# Altium footprint library ParsaLibrary.PcbLib: 526 footprints (part 26 of 33)
Each footprint in its own frame and in the unit in brackets; x right, y up, seen from the top. Pads: shape width x height; smd on the part's side, far side on the other; paste and mask are expansions set on the pad; w line width, h text height; cw(c..) or ccw(c..) is an arc to the next point about the centre after c.
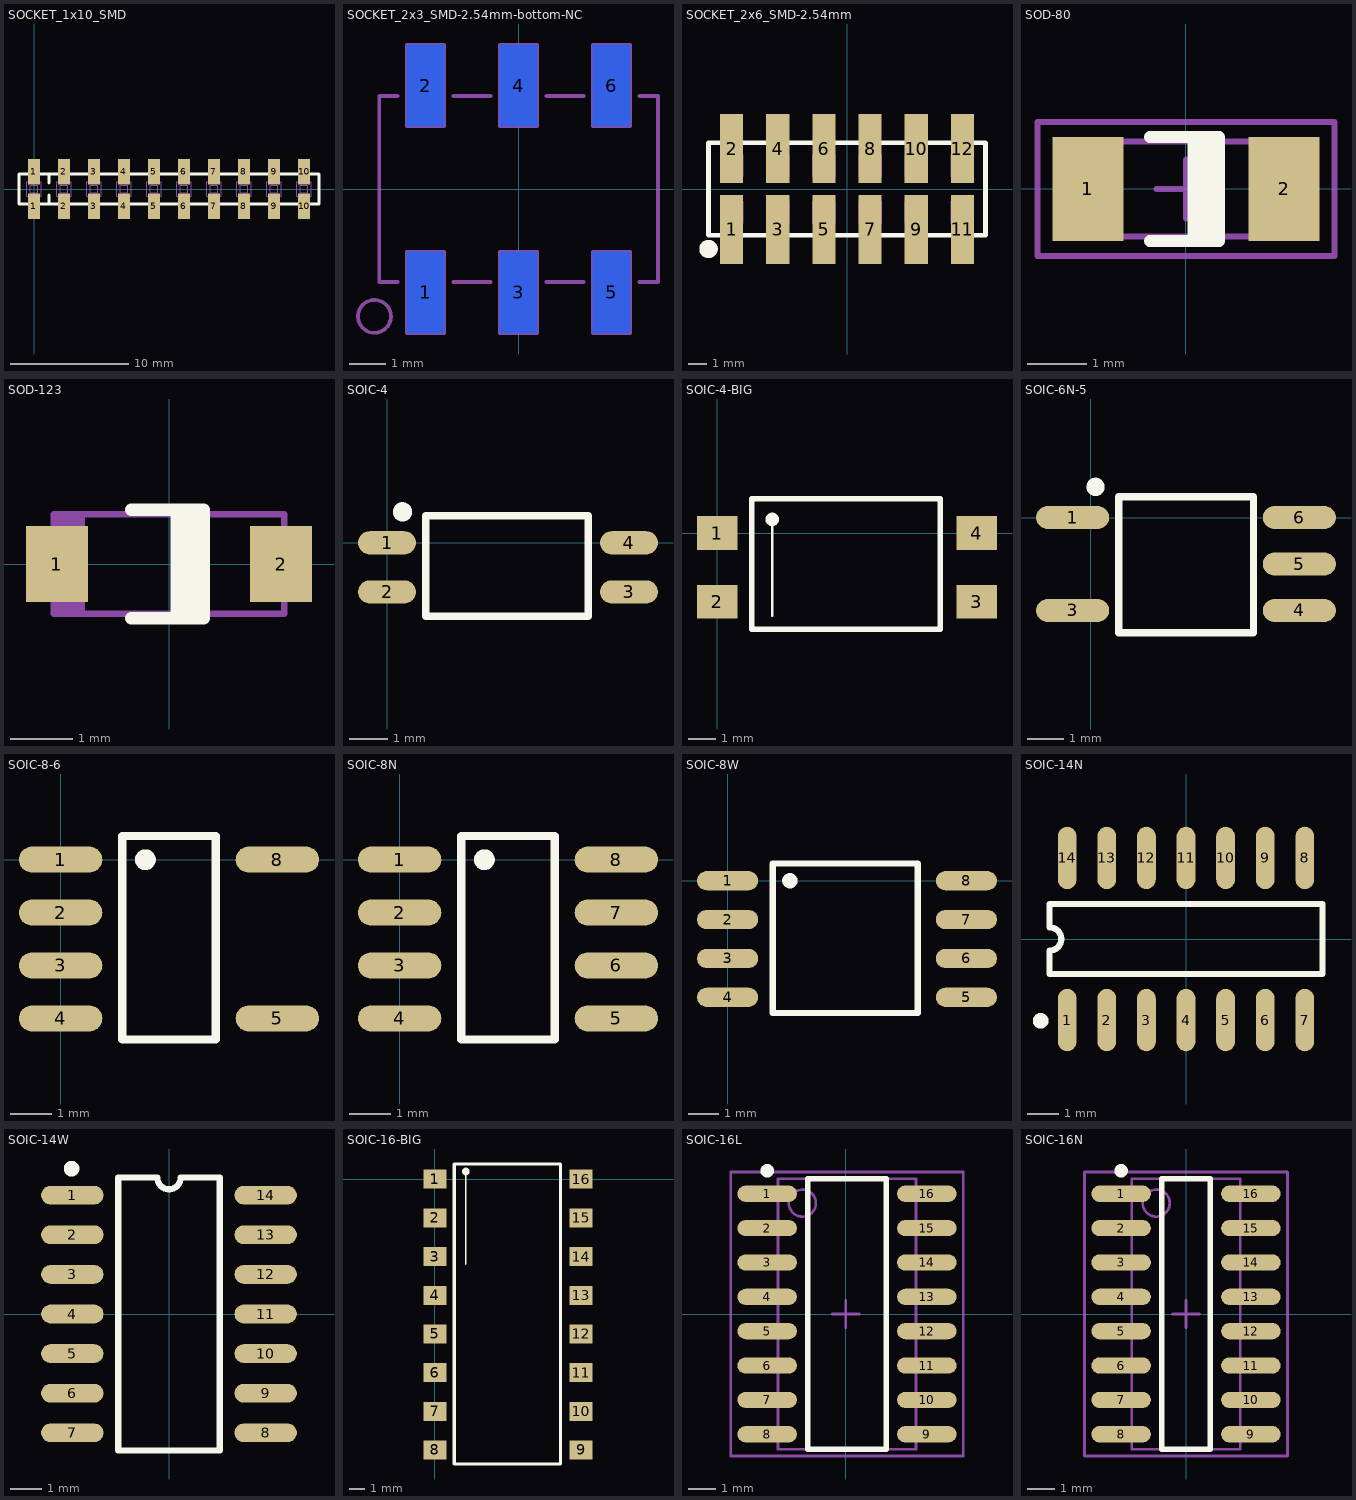
[diagram p25: the footprints below, top view; thin cyan lines are the x and y axes]

## SOCKET_1x10_SMD [mm]
pads (20):
  rect 1.02x2.19 smd: 1(0,-1.465) 1(0,1.465) 2(2.54,-1.465) 2(2.54,1.465) 3(5.08,-1.465) 3(5.08,1.465) 4(7.62,-1.465) 4(7.62,1.465) 5(10.16,-1.465) 5(10.16,1.465) 6(12.7,-1.465) 6(12.7,1.465) 7(15.24,-1.465) 7(15.24,1.465) 8(17.78,-1.465) 8(17.78,1.465) 9(20.32,-1.465) 9(20.32,1.465) 10(22.86,-1.465) 10(22.86,1.465)
Top Overlay:
  lines w0.254: 1.27,-1.27 1.27,-0.508 ; 1.27,0.508 1.27,1.27 ; -1.27,-1.27 24.13,-1.27 24.13,1.27 -1.27,1.27 -1.27,-1.27
Mechanical 7:
  lines w0.1: -0.35,-1.27 -0.35,-1.812 ccw(c0,-1.812) 0.35,-1.812 0.35,-1.27 ; 2.19,1.27 2.19,1.812 cw(c2.54,1.812) 2.89,1.812 2.89,1.27 ; 4.73,-1.27 4.73,-1.812 ccw(c5.08,-1.812) 5.43,-1.812 5.43,-1.27 ; 7.27,1.27 7.27,1.812 cw(c7.62,1.812) 7.97,1.812 7.97,1.27 ; 9.81,-1.27 9.81,-1.812 ccw(c10.16,-1.812) 10.51,-1.812 10.51,-1.27 ; 12.35,1.27 12.35,1.812 cw(c12.7,1.812) 13.05,1.812 13.05,1.27 ; 14.89,-1.27 14.89,-1.812 ccw(c15.24,-1.812) 15.59,-1.812 15.59,-1.27 ; 17.43,1.27 17.43,1.812 cw(c17.78,1.812) 18.13,1.812 18.13,1.27 ; 19.97,-1.27 19.97,-1.812 ccw(c20.32,-1.812) 20.67,-1.812 20.67,-1.27 ; 22.51,1.27 22.51,1.812 cw(c22.86,1.812) 23.21,1.812 23.21,1.27 ; -1.27,-1.27 -1.27,1.27 24.13,1.27 24.13,-1.27 -1.27,-1.27 ; -0.6,-0.6 -0.6,0.6 0.6,0.6 0.6,-0.6 -0.6,-0.6 ; -0.3,-0.3 -0.3,0.3 0.3,0.3 0.3,-0.3 -0.3,-0.3 ; 1.94,-0.6 1.94,0.6 3.14,0.6 3.14,-0.6 1.94,-0.6 ; 2.24,-0.3 2.24,0.3 2.84,0.3 2.84,-0.3 2.24,-0.3 ; 4.48,-0.6 4.48,0.6 5.68,0.6 5.68,-0.6 4.48,-0.6 ; 4.78,-0.3 4.78,0.3 5.38,0.3 5.38,-0.3 4.78,-0.3 ; 7.02,-0.6 7.02,0.6 8.22,0.6 8.22,-0.6 7.02,-0.6 ; 7.32,-0.3 7.32,0.3 7.92,0.3 7.92,-0.3 7.32,-0.3 ; 9.56,-0.6 9.56,0.6 10.76,0.6 10.76,-0.6 9.56,-0.6 ; 9.86,-0.3 9.86,0.3 10.46,0.3 10.46,-0.3 9.86,-0.3 ; 12.1,-0.6 12.1,0.6 13.3,0.6 13.3,-0.6 12.1,-0.6 ; 12.4,-0.3 12.4,0.3 13,0.3 13,-0.3 12.4,-0.3 ; 14.64,-0.6 14.64,0.6 15.84,0.6 15.84,-0.6 14.64,-0.6 ; 14.94,-0.3 14.94,0.3 15.54,0.3 15.54,-0.3 14.94,-0.3 ; 17.18,-0.6 17.18,0.6 18.38,0.6 18.38,-0.6 17.18,-0.6 ; 17.48,-0.3 17.48,0.3 18.08,0.3 18.08,-0.3 17.48,-0.3 ; 19.72,-0.6 19.72,0.6 20.92,0.6 20.92,-0.6 19.72,-0.6 ; 20.02,-0.3 20.02,0.3 20.62,0.3 20.62,-0.3 20.02,-0.3 ; 22.26,-0.6 22.26,0.6 23.46,0.6 23.46,-0.6 22.26,-0.6 ; 22.56,-0.3 22.56,0.3 23.16,0.3 23.16,-0.3 22.56,-0.3
  text ".Designator" at 0.77,-0.2 h0.38
3D body "Samtec-SSM-110-L-SV.step": height 7.47, standoff -0.03, extent -1.27,-2.286 24.13,2.286

## SOCKET_2x3_SMD-2.54mm-bottom-NC [mm]
pads (6):
  rect 1.02x2.22 smd far side: 1(-2.54,-2.825) 2(-2.54,2.825) 3(0,-2.825) 4(0,2.825) 5(2.54,-2.825) 6(2.54,2.825)
Bottom Overlay:
  circle w0.508: c-3.936,-3.48 r0.254
  lines w0.254: -3.33,-2.54 -3.81,-2.54 -3.81,2.54 -3.33,2.54 ; -1.77,-2.54 -0.78,-2.54 ; -1.77,2.54 -0.78,2.54 ; 0.78,-2.54 1.77,-2.54 ; 0.78,2.54 1.77,2.54 ; 3.33,-2.54 3.81,-2.54 3.81,2.54 3.33,2.54
Mechanical 8:
  circle w0.1: c-3.936,-3.48 r0.45
  lines w0.1: -3.302,-2.54 -3.81,-2.54 -3.81,2.54 -3.302,2.54 ; -1.778,-2.54 -0.762,-2.54 ; -1.778,2.54 -0.762,2.54 ; 0.762,-2.54 1.778,-2.54 ; 0.762,2.54 1.778,2.54 ; 3.302,-2.54 3.81,-2.54 3.81,2.54 3.302,2.54 ; -3.05,-3.935 -3.05,-1.715 -2.03,-1.715 -2.03,-3.935 -3.05,-3.935 ; -3.05,1.715 -2.03,1.715 -2.03,3.935 -3.05,3.935 -3.05,1.715 ; -0.51,-3.935 -0.51,-1.715 0.51,-1.715 0.51,-3.935 -0.51,-3.935 ; -0.51,1.715 -0.51,3.935 0.51,3.935 0.51,1.715 -0.51,1.715 ; 2.03,-3.935 2.03,-1.715 3.05,-1.715 3.05,-3.935 2.03,-3.935 ; 2.03,1.715 2.03,3.935 3.05,3.935 3.05,1.715 2.03,1.715
  text ".Designator" at -3.226,0.178 h0.38

## SOCKET_2x6_SMD-2.54mm [mil]
pads (12):
  rect 50x150 smd: 1(-250,-87.5) 2(-250,87.5) 3(-150,-87.5) 4(-150,87.5) 5(-50,-87.5) 6(-50,87.5) 7(50,-87.5) 8(50,87.5) 9(150,-87.5) 10(150,87.5) 11(250,-87.5) 12(250,87.5)
Top Overlay:
  circle w20: c-300,-130 r10
  lines w10: -300,-100 300,-100 300,100 -300,100 -300,-100
Mechanical 7:
  lines w3.94: -263.78,-100 -263.78,-121.32 ccw(c-250,-121.32) -236.22,-121.32 -236.22,-100 ; -263.78,100 -263.78,121.32 cw(c-250,121.32) -236.22,121.32 -236.22,100 ; -163.78,-100 -163.78,-121.32 ccw(c-150,-121.32) -136.22,-121.32 -136.22,-100 ; -163.78,100 -163.78,121.32 cw(c-150,121.32) -136.22,121.32 -136.22,100 ; -63.78,-100 -63.78,-121.32 ccw(c-50,-121.32) -36.22,-121.32 -36.22,-100 ; -63.78,100 -63.78,121.32 cw(c-50,121.32) -36.22,121.32 -36.22,100 ; 36.22,-100 36.22,-121.32 ccw(c50,-121.32) 63.78,-121.32 63.78,-100 ; 36.22,100 36.22,121.32 cw(c50,121.32) 63.78,121.32 63.78,100 ; 136.22,-100 136.22,-121.32 ccw(c150,-121.32) 163.78,-121.32 163.78,-100 ; 136.22,100 136.22,121.32 cw(c150,121.32) 163.78,121.32 163.78,100 ; 236.22,-100 236.22,-121.32 ccw(c250,-121.32) 263.78,-121.32 263.78,-100 ; 236.22,100 236.22,121.32 cw(c250,121.32) 263.78,121.32 263.78,100 ; -300,-100 -300,100 300,100 300,-100 -300,-100 ; -273.62,-73.62 -273.62,-26.38 -226.38,-26.38 -226.38,-73.62 -273.62,-73.62 ; -273.62,26.38 -226.38,26.38 -226.38,73.62 -273.62,73.62 -273.62,26.38 ; -261.81,-61.81 -261.81,-38.19 -238.19,-38.19 -238.19,-61.81 -261.81,-61.81 ; -261.81,38.19 -238.19,38.19 -238.19,61.81 -261.81,61.81 -261.81,38.19 ; -173.62,-73.62 -173.62,-26.38 -126.38,-26.38 -126.38,-73.62 -173.62,-73.62 ; -173.62,26.38 -126.38,26.38 -126.38,73.62 -173.62,73.62 -173.62,26.38 ; -161.81,-61.81 -161.81,-38.19 -138.19,-38.19 -138.19,-61.81 -161.81,-61.81 ; -161.81,38.19 -138.19,38.19 -138.19,61.81 -161.81,61.81 -161.81,38.19 ; -73.62,-73.62 -73.62,-26.38 -26.38,-26.38 -26.38,-73.62 -73.62,-73.62 ; -73.62,26.38 -26.38,26.38 -26.38,73.62 -73.62,73.62 -73.62,26.38 ; -61.81,-61.81 -61.81,-38.19 -38.19,-38.19 -38.19,-61.81 -61.81,-61.81 ; -61.81,38.19 -38.19,38.19 -38.19,61.81 -61.81,61.81 -61.81,38.19 ; 26.38,-73.62 26.38,-26.38 73.62,-26.38 73.62,-73.62 26.38,-73.62 ; 26.38,26.38 73.62,26.38 73.62,73.62 26.38,73.62 26.38,26.38 ; 38.19,-61.81 38.19,-38.19 61.81,-38.19 61.81,-61.81 38.19,-61.81 ; 38.19,38.19 61.81,38.19 61.81,61.81 38.19,61.81 38.19,38.19 ; 126.38,-73.62 126.38,-26.38 173.62,-26.38 173.62,-73.62 126.38,-73.62 ; 126.38,26.38 173.62,26.38 173.62,73.62 126.38,73.62 126.38,26.38 ; 138.19,-61.81 138.19,-38.19 161.81,-38.19 161.81,-61.81 138.19,-61.81 ; 138.19,38.19 161.81,38.19 161.81,61.81 138.19,61.81 138.19,38.19 ; 226.38,-73.62 226.38,-26.38 273.62,-26.38 273.62,-73.62 226.38,-73.62 ; 226.38,26.38 273.62,26.38 273.62,73.62 226.38,73.62 226.38,26.38 ; 238.19,-61.81 238.19,-38.19 261.81,-38.19 261.81,-61.81 238.19,-61.81 ; 238.19,38.19 261.81,38.19 261.81,61.81 238.19,61.81 238.19,38.19
  text ".Designator" at -277,-7 h15
3D body "SSM-106-F-DV.stp": height 290, standoff -2, extent -299.99,-138.49 300.01,138.51

## SOD-80 [mm] "MINI MELF"
pads (2):
  rect 1.2x1.75 smd: 1(-1.65,0) 2(1.65,0)
Top Overlay:
  region: 0.573,0.875 0.023,0.875 0.023,-0.875 0.573,-0.875
  lines w0.2: -0.61,-0.875 0.559,-0.875 0.559,0.875 -0.61,0.875
Mechanical 13:
  rectangle: -1.85,-0.8 -1.352,0.8
  lines w0.1: -1.85,-0.8 -1.85,0.8 1.85,0.8 1.85,-0.8 -1.85,-0.8
Mechanical 15:
  lines w0.1: -0.5,0 0.5,0 ; 0,-0.5 0,0.5 ; -2.5,-1.125 -2.5,1.125 2.5,1.125 2.5,-1.125 -2.5,-1.125
3D body "User Library-Diode MELF.STEP": height 1.55, standoff 0.05, extent -1.775,-0.75 1.725,0.75

## SOD-123 [mm]
pads (2):
  rect 1x1.22 smd: 1(-1.8,0) 2(1.8,0)
Top Overlay:
  region: 0.573,0.875 0.023,0.875 0.023,-0.875 0.573,-0.875
  lines w0.2: -0.61,-0.875 0.559,-0.875 0.559,0.875 -0.61,0.875
Mechanical 13:
  rectangle: -1.85,-0.8 -1.352,0.8
  lines w0.1: -1.85,-0.8 1.85,-0.8 1.85,0.8 -1.85,0.8 -1.85,-0.8
3D body "User Library-SOD123-1.step": height 1.18, standoff 0, extent -1.95,-0.9 1.95,0.9

## SOIC-4 [mm]
pads (4):
  oval 1.5x0.6 smd: 1(0,0) 2(0,-1.27) 3(6.25,-1.27) 4(6.25,0)
Top Overlay:
  circle w0.25: c0.4,0.8 r0.125
  lines w0.2: 1,-1.9 5.2,-1.9 5.2,0.7 1,0.7 1,-1.9
3D body "User Library-ACPL-217-56DE.step": height 2.01, standoff -0.12, extent -0.5,-1.9 6.5,0.7

## SOIC-4-BIG [mm]
pads (4):
  rect 1.5x1.25 smd: 1(0,0) 2(0,-2.54) 3(9.6,-2.54) 4(9.6,0)
Top Overlay:
  circle w0.25: c2.032,0.508 r0.125
  lines w0.1: 2.032,-3.048 2.032,0.635
  lines w0.2: 1.27,-3.556 8.255,-3.556 8.255,1.27 1.27,1.27 1.27,-3.556
3D body "User Library-PC817_Gullwing.STEP": height 3.85, standoff 0, extent -0.174,-3.56 9.826,1.02

## SOIC-6N-5 [mm]
pads (5):
  oval 2x0.625 smd: 1(-0.5,0) 3(-0.5,-2.54) 4(5.7,-2.54) 5(5.7,-1.27) 6(5.7,0)
Top Overlay:
  circle w0.25: c0.127,0.838 r0.125
  lines w0.2: 0.762,-3.15 0.762,0.565 4.445,0.565 4.445,-3.15 0.762,-3.15
3D body "5pin_SO6_z90.stp": height 2.2, standoff 0, extent -0.909,-3.12 6.091,0.58

## SOIC-8-6 [mm]
pads (6):
  oval 2x0.625 smd: 1(0,0) 2(0,-1.27) 3(0,-2.54) 4(0,-3.81) 5(5.2,-3.81) 8(5.2,0)
Top Overlay:
  circle w0.25: c2.032,-0.002 r0.125
  lines w0.2: 1.475,-4.318 1.475,0.565 3.725,0.565 3.725,-4.318 1.475,-4.318
3D body "SOIC08 narrow.stp": height 2, standoff 0, extent -0.567,-4.43 5.596,0.57

## SOIC-8N [mm]
pads (8):
  oval 2x0.625 smd: 1(0,0) 2(0,-1.27) 3(0,-2.54) 4(0,-3.81) 5(5.2,-3.81) 6(5.2,-2.54) 7(5.2,-1.27) 8(5.2,0)
Top Overlay:
  circle w0.25: c2.032,-0.002 r0.125
  lines w0.2: 1.475,-4.318 1.475,0.565 3.725,0.565 3.725,-4.318 1.475,-4.318
3D body "SOIC08 narrow.stp": height 2, standoff 0, extent -0.567,-4.43 5.596,0.57

## SOIC-8W [mm]
pads (8):
  oval 2x0.625 smd: 1(0,0) 2(0,-1.27) 3(0,-2.54) 4(0,-3.81) 5(7.8,-3.81) 6(7.8,-2.54) 7(7.8,-1.27) 8(7.8,0)
Top Overlay:
  circle w0.25: c2.032,-0.002 r0.125
  lines w0.2: 1.475,-4.318 6.212,-4.318 6.212,0.565 1.475,0.565 1.475,-4.318
3D body "User Library-SOIC8_(ATTINY12).step": height 2.3, standoff -0.02, extent -0.296,-4.595 8.096,0.785

## SOIC-14N [mm]
pads (14):
  oval 0.6x2 smd: 1(-3.81,-2.6) 2(-2.54,-2.6) 3(-1.27,-2.6) 4(0,-2.6) 5(1.27,-2.6) 6(2.54,-2.6) 7(3.81,-2.6) 8(3.81,2.6) 9(2.54,2.6) 10(1.27,2.6) 11(0,2.6) 12(-1.27,2.6) 13(-2.54,2.6) 14(-3.81,2.6)
Top Overlay:
  circle w0.25: c-4.66,-2.625 r0.125
  lines w0.2: -4.375,-1.125 -4.375,-0.375 ccw(c-4.375,0) -4.375,0.375 -4.375,1.125 4.375,1.125 4.375,-1.125 -4.375,-1.125
3D body "SOIC14 narrow.stp": height 2, standoff 0, extent -4.394,-3.132 4.416,3.031

## SOIC-14W [mm]
pads (14):
  oval 2x0.6 smd: 1(-3.1,3.81) 2(-3.1,2.54) 3(-3.1,1.27) 4(-3.1,0) 5(-3.1,-1.27) 6(-3.1,-2.54) 7(-3.1,-3.81) 8(3.1,-3.81) 9(3.1,-2.54) 10(3.1,-1.27) 11(3.1,0) 12(3.1,1.27) 13(3.1,2.54) 14(3.1,3.81)
Top Overlay:
  circle w0.25: c-3.125,4.66 r0.125
  lines w0.2: -1.625,-4.375 1.625,-4.375 1.625,4.375 0.375,4.375 cw(c0,4.375) -0.375,4.375 -1.625,4.375 -1.625,-4.375
3D body "User Library-SOIC-14.step": height 1.75, standoff 0, extent -3,-4.375 3,4.375

## SOIC-16-BIG [mm]
pads (16):
  rect 1.5x1.25 smd: 1(0,0) 2(0,-2.54) 3(0,-5.08) 4(0,-7.62) 5(0,-10.16) 6(0,-12.7) 7(0,-15.24) 8(0,-17.78) 9(9.6,-17.78) 10(9.6,-15.24) 11(9.6,-12.7) 12(9.6,-10.16) 13(9.6,-7.62) 14(9.6,-5.08) 15(9.6,-2.54) 16(9.6,0)
Top Overlay:
  circle w0.25: c2.032,0.508 r0.125
  lines w0.1: 2.032,-5.588 2.032,-1.905 ; 2.032,-3.048 2.032,0.635
  lines w0.2: 1.27,-3.556 1.27,1 8.255,1 8.255,-3.556 ; 1.27,-1.27 1.27,-18.7 8.255,-18.7 8.255,-1.27
3D body "User Library-PC817_Gullwing.STEP": height 3.85, standoff 0, extent -0.174,-18.8 9.826,-14.22
3D body "User Library-PC817_Gullwing.STEP": height 3.85, standoff 0, extent -0.174,-16.26 9.826,-11.68
3D body "User Library-PC817_Gullwing.STEP": height 3.85, standoff 0, extent -0.174,-13.72 9.826,-9.14
3D body "User Library-PC817_Gullwing.STEP": height 3.85, standoff 0, extent -0.174,-11.18 9.826,-6.6
3D body "User Library-PC817_Gullwing.STEP": height 3.85, standoff 0, extent -0.174,-8.64 9.826,-4.06
3D body "User Library-PC817_Gullwing.STEP": height 3.85, standoff 0, extent -0.174,-6.1 9.826,-1.52
3D body "User Library-PC817_Gullwing.STEP": height 3.85, standoff 0, extent -0.174,-3.56 9.826,1.02

## SOIC-16L [mm]
pads (16):
  oval 2.2x0.6 smd: 1(-2.9,4.445) 2(-2.9,3.175) 3(-2.9,1.905) 4(-2.9,0.635) 5(-2.9,-0.635) 6(-2.9,-1.905) 7(-2.9,-3.175) 8(-2.9,-4.445) 9(3,-4.445) 10(3,-3.175) 11(3,-1.905) 12(3,-0.635) 13(3,0.635) 14(3,1.905) 15(3,3.175) 16(3,4.445)
Top Overlay:
  circle w0.25: c-2.9,5.295 r0.125
  lines w0.2: -1.4,-5 1.5,-5 1.5,5 -1.4,5 -1.4,-5
Mechanical 13:
  circle w0.1: c-1.6,4.1 r0.5
  lines w0.1: -2.5,-5 2.6,-5 2.6,5 -2.5,5 -2.5,-5
Mechanical 15:
  lines w0.1: -0.5,0 0.5,0 ; 0,-0.5 0,0.5 ; -4.25,-5.25 4.35,-5.25 4.35,5.25 -4.25,5.25 -4.25,-5.25
3D body "User Library-SOIC-16L (127P690X210).step": height 2.1, standoff 0, extent -3.5,-5.2 3.5,5.2

## SOIC-16N [mm]
pads (16):
  oval 2.2x0.6 smd: 1(-2.4,4.445) 2(-2.4,3.175) 3(-2.4,1.905) 4(-2.4,0.635) 5(-2.4,-0.635) 6(-2.4,-1.905) 7(-2.4,-3.175) 8(-2.4,-4.445) 9(2.4,-4.445) 10(2.4,-3.175) 11(2.4,-1.905) 12(2.4,-0.635) 13(2.4,0.635) 14(2.4,1.905) 15(2.4,3.175) 16(2.4,4.445)
Top Overlay:
  circle w0.25: c-2.4,5.295 r0.125
  lines w0.2: -0.9,-5 -0.9,5 0.9,5 0.9,-5 -0.9,-5
Mechanical 13:
  circle w0.1: c-1.1,4.1 r0.5
  lines w0.1: -2,-5 -2,5 2,5 2,-5 -2,-5
Mechanical 15:
  lines w0.1: -0.5,0 0.5,0 ; 0,-0.5 0,0.5 ; -3.75,-5.25 -3.75,5.25 3.75,5.25 3.75,-5.25 -3.75,-5.25
3D body "SOIC16 narrow.stp": height 2, standoff 0, extent -3.158,-5.025 3.005,5.055